# Altium footprint library DIP Component.PcbLib: 327 footprints (part 15 of 21)
Each footprint in its own frame and in the unit in brackets; x right, y up, seen from the top. Pads: shape width x height; smd on the part's side, far side on the other; paste and mask are expansions set on the pad; w line width, h text height; cw(c..) or ccw(c..) is an arc to the next point about the centre after c.
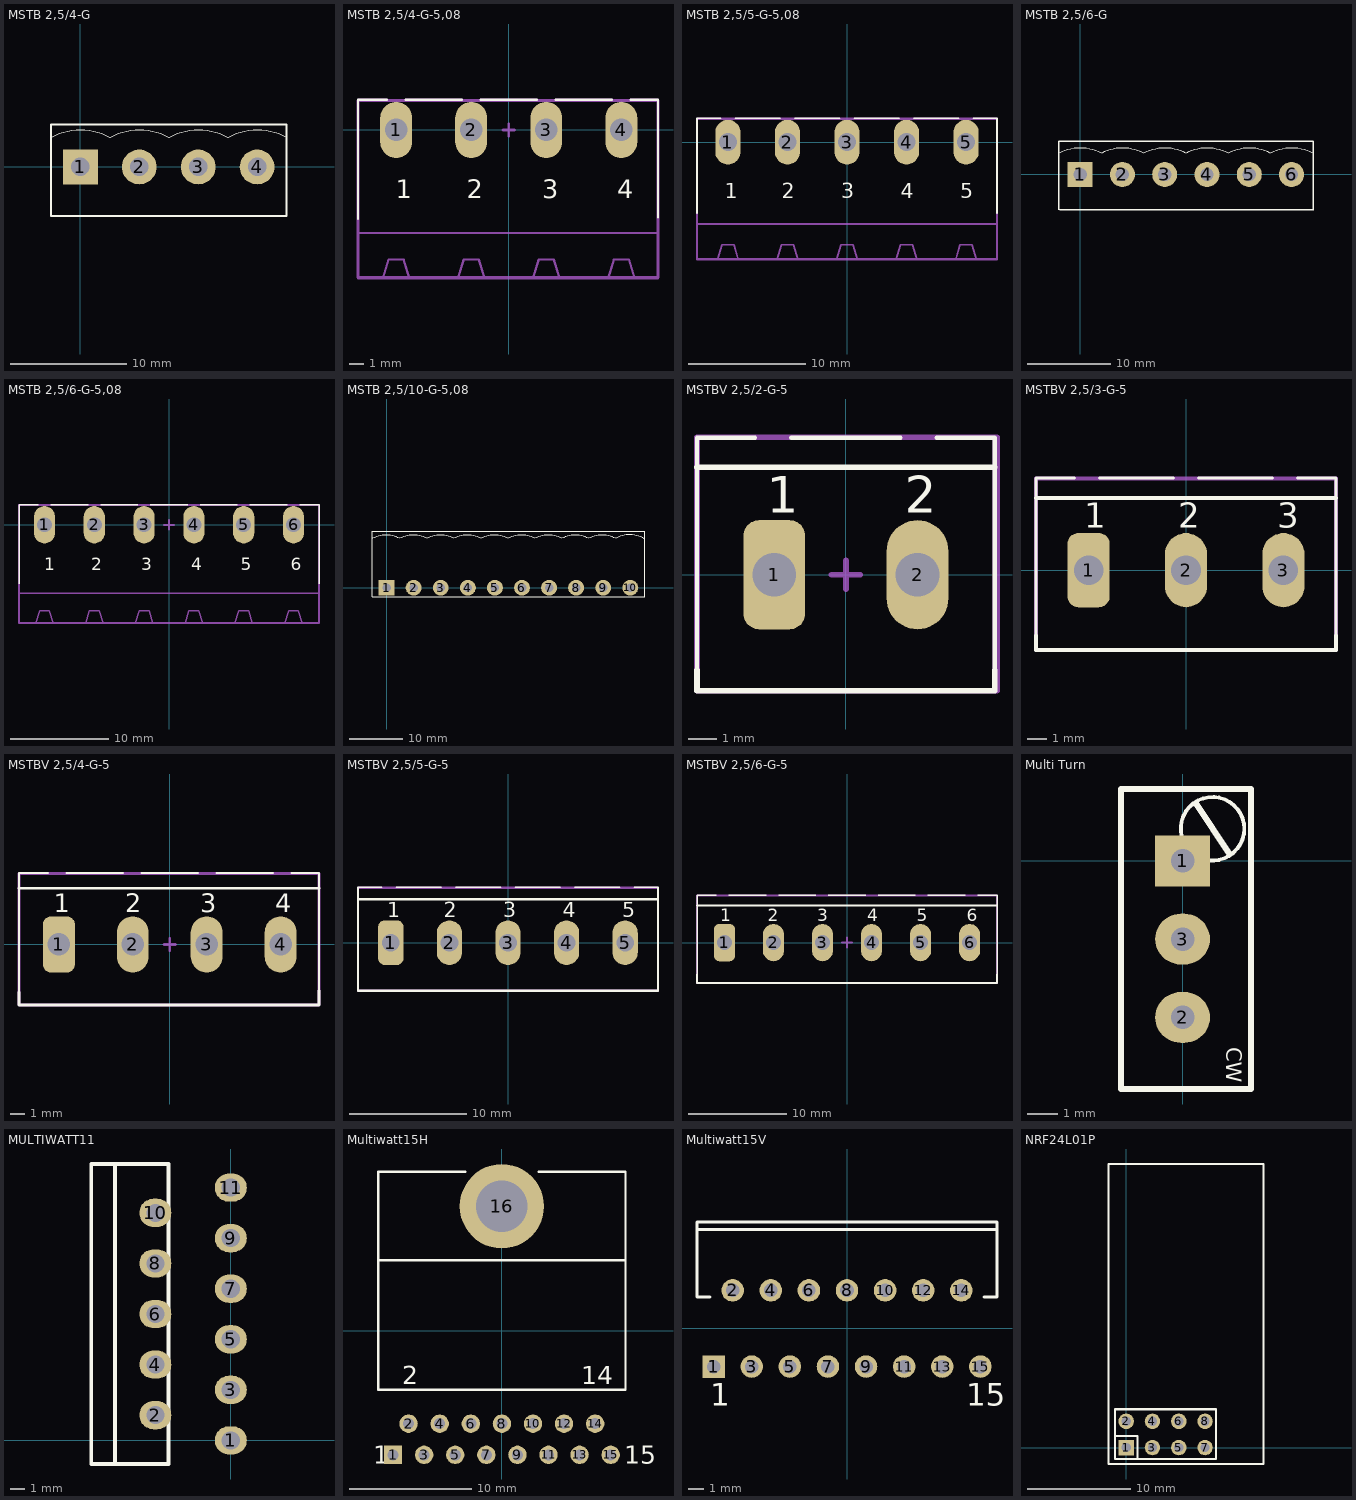
[diagram p14: the footprints below, top view; thin cyan lines are the x and y axes]

## MSTB 2,5/4-G [mm] "fonics"
pads (4):
  rect 3x3 hole 1.6: 1(0,0)
  round 3 hole 1.6: 2(5.08,0) 3(10.16,0) 4(15.24,0)
Top Overlay:
  lines w0.1: -2.5,2.54 cw(c0.02,-2.143) 2.54,2.54 ; 2.58,2.54 cw(c5.1,-2.143) 7.62,2.54 ; 7.66,2.54 cw(c10.18,-2.143) 12.7,2.54 ; 12.74,2.54 cw(c15.26,-2.143) 17.78,2.54
  lines w0.178: -2.55,3.659 17.78,3.659 17.78,-4.211 ; -2.54,-4.2 -2.54,3.659 ; -2.52,-4.211 17.75,-4.211

## MSTB 2,5/4-G-5,08 [mil] "Header, Nominal current: 12 A Rated voltage (III/2): 320 V Number of positions: 4 Pitch: 5,08 mm Color: green Contact surface: Tin Assembly: Soldering  DESIGNER ABBAS BASEREH"
height 338.58
pads (4):
  oval 85x150 hole 60: 1(-300,0) 2(-100,0) 3(100,0) 4(300,0)
Top Overlay:
  lines w6: -401.57,-236.57 -401.57,80 -325,80 ; -275,80 -125,80 ; -75,80 75,80 ; 125,80 275,80 ; 325,80 397.64,80 397.64,-232.64
  text "4" at 288.74,-182.48 h50
  text "3" at 88.74,-182.48 h50
  text "2" at -111.26,-182.48 h50
  text "1" at -301.26,-182.48 h50
Mechanical 13:
  lines w6: -397.64,-275 397.64,-275 ; -325,80 -401.57,80 -401.57,-236.57 -401.57,-395 -335,-395 ; -275,80 -125,80 ; -75,80 75,80 ; 125,80 275,80 ; 325,80 397.64,80 397.64,-232.64 397.64,-395 335,-395 ; -335,-395 -265,-395 ; -335,-395 -320,-345 -280,-345 -265,-395 ; -265,-395 -135,-395 ; -135,-395 -65,-395 ; -135,-395 -120,-345 -80,-345 -65,-395 ; -65,-395 65,-395 ; 65,-395 80,-345 120,-345 135,-395 ; 65,-395 135,-395 ; 135,-395 265,-395 ; 265,-395 280,-345 320,-345 335,-395 ; 265,-395 335,-395
Mechanical 15:
  lines w7.87: -15.75,0 15.75,0 ; 0,-15.75 0,15.75 ; -401.57,-393.7 397.64,-393.7 397.64,78.74 -401.57,78.74 -401.57,-393.7
3D body "User Library-MSTB 2,5-4-G-5,08 1759033.STEP": height 338.58, standoff -137.8, extent -400,-393.79 400,78.74

## MSTB 2,5/5-G-5,08 [mil] "Header, Nominal current: 12 A Rated voltage (III/2): 320 V Number of positions: 5 Pitch: 5,08 mm Color: green Contact surface: Tin Assembly: Soldering  DESIGNER ABBAS BASEREH"
height 338.58
pads (5):
  oval 85x150 hole 60: 1(-400,0) 2(-200,0) 3(0,0) 4(200,0) 5(400,0)
Top Overlay:
  lines w6: -503.94,-238.94 -503.94,80 -425,80 ; -375,80 -225,80 ; -175,80 -25,80 ; 25,80 175,80 ; 225,80 375,80 ; 425,80 503.94,80 503.94,-238.94
  text "5" at 380,-189.37 h50
  text "4" at 180,-189.37 h50
  text "3" at -20,-189.37 h50
  text "2" at -220,-189.37 h50
  text "1" at -410,-189.37 h50
Mechanical 13:
  lines w6: -503.94,-275 503.94,-275 ; -425,80 -503.94,80 -503.94,-238.94 -503.94,-395 -435,-395 ; -375,80 -225,80 ; -175,80 -25,80 ; 25,80 175,80 ; 225,80 375,80 ; 425,80 503.94,80 503.94,-238.94 503.94,-395 435,-395 ; -435,-395 -420,-345 -380,-345 -365,-395 ; -435,-395 -365,-395 ; -365,-395 -235,-395 ; -235,-395 -220,-345 -180,-345 -165,-395 ; -235,-395 -165,-395 ; -165,-395 -35,-395 ; -35,-395 35,-395 ; -35,-395 -20,-345 20,-345 35,-395 ; 35,-395 165,-395 ; 165,-395 235,-395 ; 165,-395 180,-345 220,-345 235,-395 ; 235,-395 365,-395 ; 365,-395 435,-395 ; 365,-395 380,-345 420,-345 435,-395
Mechanical 15:
  lines w7.87: -503.94,-393.7 503.94,-393.7 503.94,78.74 -503.94,78.74 -503.94,-393.7
3D body "User Library-MSTB 2,5-5-G-5,08 1759046.STEP": height 338.58, standoff -137.8, extent -500,-393.79 500,78.74

## MSTB 2,5/6-G [mm]
pads (6):
  rect 3x3 hole 1.6: 1(0,0)
  round 3 hole 1.6: 2(5.08,0) 3(10.16,0) 4(15.24,0) 5(20.32,0) 6(25.4,0)
Top Overlay:
  lines w0.1: -2.5,2.54 cw(c0.02,-2.143) 2.54,2.54 ; 2.58,2.54 cw(c5.1,-2.143) 7.62,2.54 ; 7.66,2.54 cw(c10.18,-2.143) 12.7,2.54 ; 12.74,2.54 cw(c15.26,-2.143) 17.78,2.54 ; 17.82,2.54 cw(c20.34,-2.143) 22.86,2.54 ; 22.9,2.54 cw(c25.42,-2.143) 27.94,2.54
  lines w0.178: -2.54,-4.231 -2.54,3.97 27.98,3.97 27.98,-4.2 27.949,-4.231 ; -2.45,-4.231 28.039,-4.231

## MSTB 2,5/6-G-5,08 [mil] "Header, Nominal current: 12 A Rated voltage (III/2): 320 V Number of positions: 6 Pitch: 5,08 mm Color: green Contact surface: Tin Assembly: Soldering  DESIGNER ABBAS BASEREH"
height 338.58
pads (6):
  oval 85x150 hole 60: 1(-500,0) 2(-300,0) 3(-100,0) 4(100,0) 5(300,0) 6(500,0)
Top Overlay:
  lines w6: -602.36,-237.36 -602.36,80 -525,80 ; -475,80 -325,80 ; -275,80 -125,80 ; -75,80 75,80 ; 125,80 275,80 ; 325,80 475,80 ; 525,80 602.36,80 602.36,-237.36
  text "1" at -501.26,-182.48 h50
  text "2" at -311.26,-182.48 h50
  text "3" at -111.26,-182.48 h50
  text "4" at 88.74,-182.48 h50
  text "5" at 288.74,-182.48 h50
  text "6" at 488.74,-182.48 h50
Mechanical 13:
  lines w6: -602.36,-275 602.36,-275 ; -525,80 -602.36,80 -602.36,-237.36 -602.36,-395 -535,-395 ; -475,80 -325,80 ; -275,80 -125,80 ; -75,80 75,80 ; 125,80 275,80 ; 325,80 475,80 ; 525,80 602.36,80 602.36,-237.36 602.36,-395 535,-395 ; -535,-395 -520,-345 -480,-345 -465,-395 ; -535,-395 -465,-395 ; -465,-395 -335,-395 ; -335,-395 -320,-345 -280,-345 -265,-395 ; -335,-395 -265,-395 ; -265,-395 -135,-395 ; -135,-395 -65,-395 ; -135,-395 -120,-345 -80,-345 -65,-395 ; -65,-395 65,-395 ; 65,-395 135,-395 ; 65,-395 80,-345 120,-345 135,-395 ; 135,-395 265,-395 ; 265,-395 335,-395 ; 265,-395 280,-345 320,-345 335,-395 ; 335,-395 465,-395 ; 465,-395 535,-395 ; 465,-395 480,-345 520,-345 535,-395
Mechanical 15:
  lines w7.87: -19.68,0 19.68,0 ; 0,-19.68 0,19.68 ; -602.36,-393.7 -602.36,78.74 602.36,78.74 602.36,-393.7 -602.36,-393.7
3D body "User Library-MSTB 2,5-6-G-5,08 1759059.STEP": height 338.58, standoff -137.8, extent -600,-393.79 600,78.74

## MSTB 2,5/10-G-5,08 [mm]
pads (10):
  rect 3x3 hole 1.6: 1(0,0)
  round 3 hole 1.6: 2(5.08,0) 3(10.16,0) 4(15.24,0) 5(20.32,0) 6(25.4,0) 7(30.48,0) 8(35.56,0) 9(40.64,0) 10(45.72,0)
Top Overlay:
  lines w0.1: -2.565,9.255 cw(c-0.045,4.573) 2.475,9.255 ; 2.515,9.255 cw(c5.035,4.573) 7.555,9.255 ; 7.595,9.255 cw(c10.115,4.573) 12.635,9.255 cw(c15.155,4.573) 17.675,9.255 ; 17.715,9.255 cw(c20.235,4.573) 22.755,9.255 ; 22.795,9.255 cw(c25.315,4.573) 27.835,9.255 cw(c30.355,4.573) 32.875,9.255 cw(c35.395,4.573) 37.915,9.255 ; 37.955,9.255 cw(c40.475,4.573) 42.995,9.255 ; 43.075,9.325 cw(c45.595,4.643) 48.358,9.186
  lines w0.178: -2.667,-1.651 -2.667,10.56 48.387,10.56 48.387,-1.651 -2.667,-1.651
3D body "Socket Green_10Pin.STEP": height 7.97, standoff -4, extent -2.667,-1.517 48.387,10.421

## MSTBV 2,5/2-G-5 [mil] "Header, Nominal current: 12 A Rated voltage (III/2): 320 V Number of positions: 2 Pitch: 5mm Color: green Contact surface: Tin Assembly: Soldering DESIGNER:ABBAS BASEREH"
height 338.58
pads (2):
  rrect50% 85x150 hole 60: 1(-98.43,0)
  oval 85x150 hole 60: 2(98.43,0)
Top Overlay:
  lines w6: -204.72,-131.46 -204.72,188.27 -125,188.27 ; -75,188.27 75,188.27 ; 125,188.27 204.72,188.27 204.72,-131.46
  lines w7.87: -204.72,-131.46 -204.72,-159.45 204.72,-159.45 204.72,-131.46 ; -204.72,147.64 204.72,147.64
  text "1" at -109.13,85.24 h50
  text "2" at 80.87,85.24 h50
Mechanical 13:
  lines w6: -204.72,-131.46 -204.72,188.27 -125,188.27 ; -75,188.27 75,188.27 ; 125,188.27 204.72,188.27 204.72,-131.46
Mechanical 15:
  lines w7.87: -19.68,0 19.68,0 ; 0,-19.68 0,19.69 ; -204.72,-159.45 207.68,-159.45 207.68,188.98 -203.74,188.98 -204.72,188.98 -204.72,-159.45
3D body "1753437.stEp": height 473.44, standoff -152.54, extent -196.85,-151.57 196.85,187.01

## MSTBV 2,5/3-G-5 [mil] "Header, Nominal current: 12 A Rated voltage (III/2): 320 V Number of positions: 3 Pitch: 5mm Color: green Contact surface: Tin Assembly: Soldering  DESIGNER:ABBAS BASEREH"
height 338.58
pads (3):
  rrect50% 85x150 hole 60: 1(-196.85,0)
  oval 85x150 hole 60: 2(0,0) 3(196.85,0)
Top Overlay:
  lines w6: -303.15,-131.85 -303.15,186.3 -225,186.3 ; -175,186.3 -25,186.3 ; 25,186.3 175,186.3 ; 225,186.3 303.15,186.3 303.15,-131.85
  lines w7.87: -303.15,-131.85 -303.15,-161.42 303.15,-161.42 303.15,-131.85 ; -303.15,145.67 303.15,145.67
  text "1" at -205.2,85.24 h50
  text "2" at -15.2,85.24 h50
  text "3" at 184.8,85.24 h50
Mechanical 13:
  lines w6: -303.15,-131.85 -303.15,186.3 -225,186.3 ; -175,186.3 -25,186.3 ; 25,186.3 175,186.3 ; 225,186.3 303.15,186.3 303.15,-131.85
Mechanical 15:
  lines w7.87: -303.15,-161.42 -299.21,-161.42 303.15,-161.42 303.15,185.04 -303.15,185.04 -303.15,-161.42
3D body "1753453.stEp": height 473.44, standoff -152.54, extent -295.28,-153.54 295.28,185.04

## MSTBV 2,5/4-G-5 [mil] "Header, Nominal current: 12 A Rated voltage (III/2): 320 V Number of positions: 4 Pitch: 5mm Color: green Contact surface: Tin Assembly: Soldering  DESIGNER ABBAS BASEREH"
height 338.58
pads (4):
  rrect50% 85x150 hole 60: 1(-295.28,0)
  oval 85x150 hole 60: 2(-98.43,0) 3(98.43,0) 4(295.28,0)
Top Overlay:
  lines w6: -401.57,-126.34 -401.57,190.24 -325,190.24 ; -275,190.24 -125,190.24 ; -75,190.24 75,190.24 ; 125,190.24 275,190.24 ; 325,190.24 397.64,190.24 397.64,-122.4
  lines w7.87: -401.57,-126.34 -401.57,-161.42 397.64,-161.42 397.64,-122.4 ; -401.57,149.61 397.64,149.61
  text "1" at -309.13,85.24 h50
  text "2" at -119.13,85.24 h50
  text "3" at 80.87,85.24 h50
  text "4" at 280.87,85.24 h50
Mechanical 13:
  lines w6: -401.57,-126.34 -401.57,190.24 -325,190.24 ; -275,190.24 -125,190.24 ; -75,190.24 75,190.24 ; 125,190.24 275,190.24 ; 325,190.24 397.64,190.24 397.64,-122.4
Mechanical 15:
  lines w7.87: -15.75,0 15.75,0 ; 0,-15.75 0,15.75 ; -401.57,-161.42 -401.57,188.98 397.64,188.98 397.64,-161.42 -401.57,-161.42
3D body "1753479.stEp": height 472.44, standoff -153.54, extent -393.7,-152.56 393.7,186.02

## MSTBV 2,5/5-G-5 [mil] "Header, Nominal current: 12 A Rated voltage (III/2): 320 V Number of positions: 5 Pitch: 5mm Color: green Contact surface: Tin Assembly: Soldering  DESIGNER ABBAS BASEREH"
height 338.58
pads (5):
  rrect50% 85x150 hole 60: 1(-393.7,0)
  oval 85x150 hole 60: 2(-196.85,0) 3(0,0) 4(196.85,0) 5(393.7,0)
Top Overlay:
  lines w6: -503.94,-132.64 -503.94,186.3 -425,186.3 ; -375,186.3 -225,186.3 ; -175,186.3 -25,186.3 ; 25,186.3 175,186.3 ; 225,186.3 375,186.3 ; 425,186.3 503.94,186.3 503.94,-132.64
  lines w7.87: -503.94,-132.64 -503.94,-161.42 503.94,-161.42 503.94,-132.64 ; -503.94,145.67 503.94,145.67
  text "1" at -406.06,86.22 h50
  text "2" at -216.06,86.22 h50
  text "3" at -16.06,86.22 h50
  text "4" at 183.94,86.22 h50
  text "5" at 383.94,86.22 h50
Mechanical 13:
  lines w6: -503.94,-132.64 -503.94,186.3 -425,186.3 ; -375,186.3 -225,186.3 ; -175,186.3 -25,186.3 ; 25,186.3 175,186.3 ; 225,186.3 375,186.3 ; 425,186.3 503.94,186.3 503.94,-132.64
Mechanical 15:
  lines w7.87: -503.94,-161.42 -503.94,185.04 503.94,185.04 503.94,-161.42 -503.94,-161.42
3D body "1753495.stEp": height 472.44, standoff -153.54, extent -492.13,-153.54 492.13,185.04

## MSTBV 2,5/6-G-5 [mil] "Header, Nominal current: 12 A Rated voltage (III/2): 320 V Number of positions: 6 Pitch: 5mm Color: green Contact surface: Tin Assembly: Soldering  DESIGNER ABBAS BASEREH"
height 338.58
pads (6):
  rrect50% 85x150 hole 60: 1(-492.13,0)
  oval 85x150 hole 60: 2(-295.28,0) 3(-98.43,0) 4(98.43,0) 5(295.28,0) 6(492.13,0)
Top Overlay:
  lines w6: -602.36,-127.13 -602.36,190.24 -525,190.24 ; -475,190.24 -325,190.24 ; -275,190.24 -125,190.24 ; -75,190.24 75,190.24 ; 125,190.24 275,190.24 ; 325,190.24 475,190.24 ; 525,190.24 602.36,190.24 602.36,-127.13
  lines w7.87: -602.36,-127.13 -602.36,-161.42 602.36,-161.42 602.36,-127.13 ; -602.36,149.61 602.36,149.61
  text "1" at -509.13,85.24 h50
  text "2" at -319.13,85.24 h50
  text "3" at -119.13,85.24 h50
  text "4" at 80.87,85.24 h50
  text "5" at 280.87,85.24 h50
  text "6" at 480.87,85.24 h50
Mechanical 13:
  lines w6: -602.36,-127.13 -602.36,190.24 -525,190.24 ; -475,190.24 -325,190.24 ; -275,190.24 -125,190.24 ; -75,190.24 75,190.24 ; 125,190.24 275,190.24 ; 325,190.24 475,190.24 ; 525,190.24 602.36,190.24 602.36,-127.13
Mechanical 15:
  lines w7.87: -19.68,0 19.68,0 ; 0,-19.68 0,19.68 ; -602.36,-161.42 -602.36,188.98 602.36,188.98 602.36,-161.42 -602.36,-161.42
3D body "1753518.stEp": height 472.44, standoff -153.54, extent -590.55,-153.54 590.55,185.04

## Multi Turn [mil] "Multi-turn potentiometer, pitch 100mils, lead diameter 0.5mm WxHxL: 4.7x7.3x6.8mm"
pads (3):
  rect 70x65 hole 30: 1(0,0)
  oval 70x65 hole 30: 2(0,-200) 3(0,-100)
Top Overlay:
  circle w5: c38.16,40.94 r40.58
  lines w7.87: 16.93,73.23 59.84,8.66 ; -78.74,-291.34 -78.74,91.73 87.4,91.73 87.4,-291.34 -78.74,-291.34
  text "CW" at 55.91,-237.8 h19.68
3D body "multiturn.STEP": height 452.18, standoff -75.38, extent -82.68,-286.61 83.07,87.4

## MULTIWATT11 [mil] "Use For L6203"
height 760
pads (11):
  oval 85x75 hole 48: 1(0,0) 2(-200,67) 3(0,134) 4(-200,201) 5(0,268) 6(-200,335) 7(0,402) 8(-200,469) 9(0,536) 10(-200,603) 11(0,670)
Top Overlay:
  lines w10: -317,732.5 -315,732.5 ; -307,-62.5 -307,732.5 ; -370,-62.5 -370,732.5 -165,732.5 -165,-62.5 -370,-62.5
3D body: height 490, standoff 60, extent -370,-62.5 -165,732.5
3D body: height 20, standoff -40, extent -11,652 11,689
3D body: height 20, standoff -40, extent -211,585 -189,622
3D body: height 20, standoff -40, extent -11,518 11,555
3D body: height 20, standoff -40, extent -211,451 -189,488
3D body: height 20, standoff -40, extent -11,384 11,421
3D body: height 20, standoff -40, extent -211,317 -189,354
3D body: height 20, standoff -40, extent -11,250 11,287
3D body: height 20, standoff -40, extent -211,183 -189,220
3D body: height 20, standoff -40, extent -11,116 11,153
3D body: height 20, standoff -40, extent -211,49 -189,86
3D body: height 20, standoff -40, extent -11,-18 11,19
3D body: height 42, standoff 20, extent -254,585 -189,622
3D body: height 62, standoff 42, extent -254,585 -232,622
3D body: height 62, standoff 42, extent -254,451 -232,488
3D body: height 42, standoff 20, extent -254,451 -189,488
3D body: height 62, standoff 42, extent -254,317 -232,354
3D body: height 42, standoff 20, extent -254,317 -189,354
3D body: height 62, standoff 42, extent -254,183 -232,220
3D body: height 42, standoff 20, extent -254,183 -189,220
3D body: height 62, standoff 42, extent -254,49 -232,86
3D body: height 42, standoff 20, extent -254,49 -189,86
3D body: height 42, standoff 20, extent -254,652 11,689
3D body: height 62, standoff 42, extent -254,652 -232,689
3D body: height 62, standoff 42, extent -254,518 -232,555
3D body: height 42, standoff 20, extent -254,518 11,555
3D body: height 62, standoff 42, extent -254,384 -232,421
3D body: height 42, standoff 20, extent -254,384 11,421
3D body: height 62, standoff 42, extent -254,250 -232,287
3D body: height 42, standoff 20, extent -254,250 11,287
3D body: height 62, standoff 42, extent -254,116 -232,153
3D body: height 42, standoff 20, extent -254,116 11,153
3D body: height 62, standoff 42, extent -254,-18 -232,19
3D body: height 42, standoff 20, extent -254,-18 11,19
3D body: height 760, standoff 62, extent -368,-61 -307,731

## Multiwatt15H [mm] "TO, Thru-Hole, Horizontal, Heatsink Mounted; 15 Bent Staggered Leads; Pitch 1.27 mm"
height 5
pads (16):
  rect 1.5x1.5 hole 0.9: 1(-8.89,-10.155)
  round 1.5 hole 0.9: 2(-7.62,-7.615) 3(-6.35,-10.155) 4(-5.08,-7.615) 5(-3.81,-10.155) 6(-2.54,-7.615) 7(-1.27,-10.155) 8(0,-7.615) 9(1.27,-10.155) 10(2.54,-7.615) 11(3.81,-10.155) 12(5.08,-7.615) 13(6.35,-10.155) 14(7.62,-7.615) 15(8.89,-10.155)
  round 6.9 hole 4.2: 16(0,10.155)
Top Overlay:
  lines w0.2: -10.1,5.755 10.1,5.755 ; -3,12.955 -10.1,12.955 -10.1,-4.845 10.1,-4.845 10.1,12.955 3,12.955
  text "1" at -10.515,-10.905 h1.5
  text "15" at 10.015,-10.905 h1.5
  text "14" at 6.495,-4.37 h1.5
  text "2" at -8.12,-4.37 h1.5
3D body "User Library-Multiwatt15H.step": height 5, standoff -1.5, extent -9.802,-10.419 9.798,13.181

## Multiwatt15V [mm] "TO, Thru-Hole, Vertical, Heatsink Mounted; 15 Bent Staggered Leads; Pitch 1.27 mm"
height 21
pads (15):
  rect 1.5x1.5 hole 0.9: 1(-8.89,-2.54)
  round 1.5 hole 0.9: 2(-7.62,2.54) 3(-6.35,-2.54) 4(-5.08,2.54) 5(-3.81,-2.54) 6(-2.54,2.54) 7(-1.27,-2.54) 8(0,2.54) 9(1.27,-2.54) 10(2.54,2.54) 11(3.81,-2.54) 12(5.08,2.54) 13(6.35,-2.54) 14(7.62,2.54) 15(8.89,-2.54)
Top Overlay:
  lines w0.2: -10,6.59 10,6.59 ; -9.144,2.09 -10,2.09 -10,7.09 10,7.09 10,2.09 9.144,2.09
  text "1" at -9.12,-5.165 h1.5
  text "15" at 7.94,-5.165 h1.5
3D body "User Library-Multiwatt15V.step": height 21.3, standoff -1, extent -9.8,-2.81 9.8,7.08

## NRF24L01P [mm] "NRFL01+ Module"
pads (8):
  rect 1.5x1.5 hole 0.9: 1(0,0)
  round 1.5 hole 0.9: 2(0,2.54) 3(2.54,0) 4(2.54,2.54) 5(5.08,0) 6(5.08,2.54) 7(7.62,0) 8(7.62,2.54)
Top Overlay:
  lines w0.2: -1.1,1.1 1.1,1.1 1.1,-1.1 ; -1.72,-1.59 13.28,-1.59 13.28,27.41 -1.72,27.41 -1.72,-1.59 ; -1.1,-1.1 -1.1,3.7 8.7,3.7 8.7,-1.1 -1.1,-1.1
3D body "User Library-NRF24L01P Module.STEP": height 15.5, standoff 0.59, extent -1.72,-1.59 13.28,27.41